# Altium footprint library Connector.PcbLib: 86 footprints (part 4 of 6)
Each footprint in its own frame and in the unit in brackets; x right, y up, seen from the top. Pads: shape width x height; smd on the part's side, far side on the other; paste and mask are expansions set on the pad; w line width, h text height; cw(c..) or ccw(c..) is an arc to the next point about the centre after c.
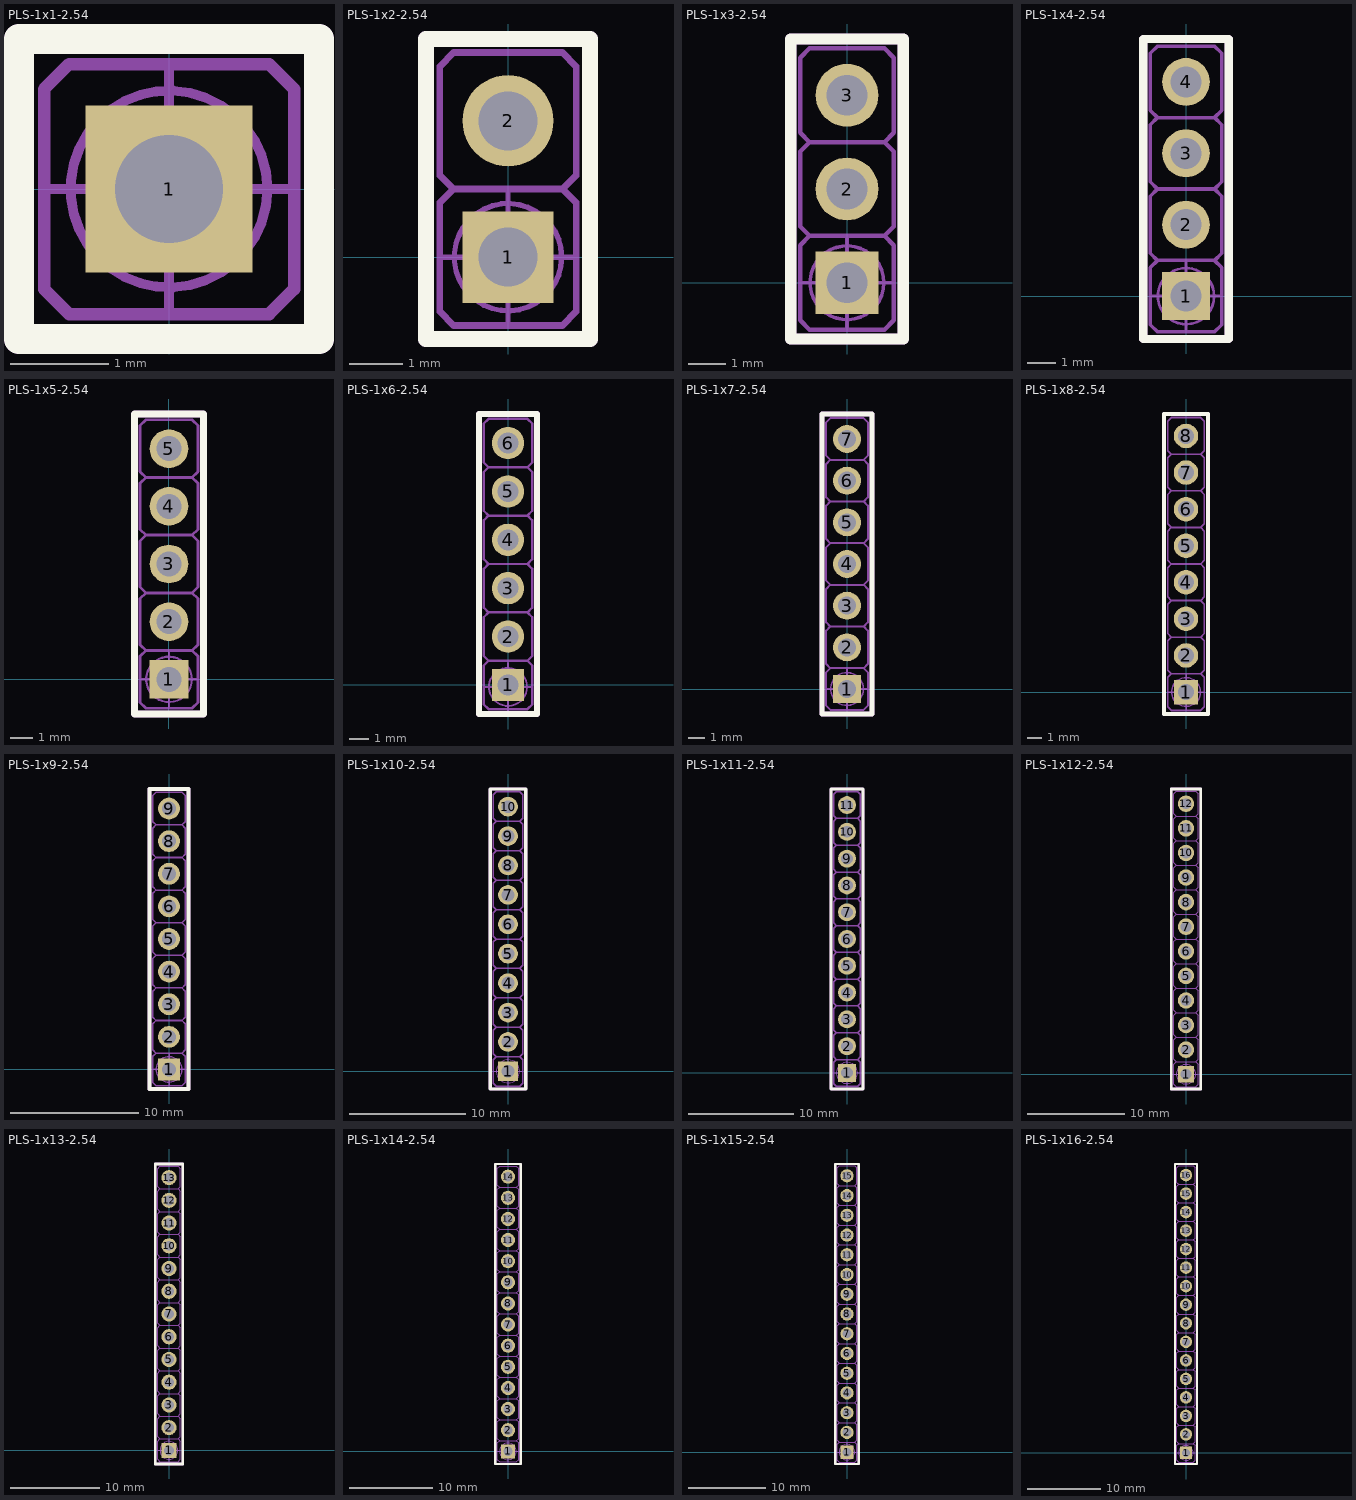
[diagram p3: the footprints below, top view; thin cyan lines are the x and y axes]

## PLS-1x1-2.54 [mm]
height 6
pads (1):
  rect 1.7x1.7 hole 1.1: 1(0,0)
Top Overlay:
  lines w0.3: -1.524,-1.524 -1.524,1.524 1.524,1.524 1.524,-1.524 -1.524,-1.524
Bottom Overlay:
  lines w0.3: -1.524,-1.524 1.524,-1.524 1.524,1.524 -1.524,1.524 -1.524,-1.524
Top Assembly:
  lines w0.127: -0.32,-0.32 0.32,-0.32 ; -0.32,-0.32 -0.16,-0.16 ; -0.32,-0.32 -0.32,0.32 ; -0.32,0.32 0.32,0.32 ; -0.32,0.32 -0.16,0.16 ; -0.16,-0.16 0.16,-0.16 ; -0.16,-0.16 -0.16,0.16 ; -0.16,0.16 0.16,0.16 ; 0.16,-0.16 0.32,-0.32 ; 0.16,-0.16 0.16,0.16 ; 0.16,0.16 0.32,0.32 ; 0.32,-0.32 0.32,0.32 ; -1.27,-1.016 -1.016,-1.27 1.016,-1.27 1.27,-1.016 1.27,1.016 1.016,1.27 -1.016,1.27 -1.27,1.016 -1.27,-1.016
Top Component Outline:
  lines w0.3: -1.524,-1.524 -1.524,1.524 1.524,1.524 1.524,-1.524 -1.524,-1.524
Top Component Center:
  circle w0.1: c0,0 r1
  lines w0.1: -1.25,0 1.25,0 ; 0,-1.25 0,1.25
3D body "PinHeader_1x01_P2.54mm_Vertical.step": height 8.54, standoff -3, extent -1.27,-1.27 1.27,1.27

## PLS-1x2-2.54 [mm]
height 6
pads (2):
  rect 1.7x1.7 hole 1.1: 1(0,0)
  round 1.7 hole 1.1: 2(0,2.54)
Top Overlay:
  lines w0.3: -1.524,-1.524 -1.524,4.064 1.524,4.064 1.524,-1.524 -1.524,-1.524
Bottom Overlay:
  lines w0.3: -1.524,-1.524 -1.524,4.064 1.524,4.064 1.524,-1.524 -1.524,-1.524
Top Assembly:
  lines w0.127: -1.016,1.27 -1.27,1.016 -1.27,-1.016 -1.016,-1.27 1.016,-1.27 1.27,-1.016 1.27,1.016 1.016,1.27 ; -1.016,1.27 -1.27,1.524 -1.27,3.556 -1.016,3.81 1.016,3.81 1.27,3.556 1.27,1.524 1.016,1.27 ; -1.016,1.27 1.016,1.27 ; -1.016,1.27 1.016,1.27 ; -0.32,-0.32 -0.32,0.32 ; -0.32,-0.32 -0.16,-0.16 ; -0.32,-0.32 0.32,-0.32 ; -0.32,0.32 -0.16,0.16 ; -0.32,0.32 0.32,0.32 ; -0.32,2.22 -0.32,2.86 ; -0.32,2.22 -0.16,2.38 ; -0.32,2.22 0.32,2.22 ; -0.32,2.86 -0.16,2.7 ; -0.32,2.86 0.32,2.86 ; -0.16,-0.16 -0.16,0.16 ; -0.16,-0.16 0.16,-0.16 ; -0.16,0.16 0.16,0.16 ; -0.16,2.38 -0.16,2.7 ; -0.16,2.38 0.16,2.38 ; -0.16,2.7 0.16,2.7 ; 0.16,-0.16 0.16,0.16 ; 0.16,-0.16 0.32,-0.32 ; 0.16,0.16 0.32,0.32 ; 0.16,2.38 0.16,2.7 ; 0.16,2.38 0.32,2.22 ; 0.16,2.7 0.32,2.86 ; 0.32,-0.32 0.32,0.32 ; 0.32,2.22 0.32,2.86
Top Component Outline:
  lines w0.3: -1.524,-1.524 1.524,-1.524 1.524,4.064 -1.524,4.064 -1.524,-1.524
Top Component Center:
  circle w0.1: c0,0 r1
  lines w0.1: -1.25,0 1.25,0 ; 0,-1.25 0,1.25
3D body "PinHeader_1x01_P2.54mm_Vertical.step": height 8.54, standoff -3, extent -1.27,1.27 1.27,3.81
3D body "PinHeader_1x01_P2.54mm_Vertical.step": height 8.54, standoff -3, extent -1.27,-1.27 1.27,1.27

## PLS-1x3-2.54 [mm]
height 6
pads (3):
  rect 1.7x1.7 hole 1.1: 1(0,0)
  round 1.7 hole 1.1: 2(0,2.54) 3(0,5.08)
Top Overlay:
  lines w0.3: -1.524,-1.524 -1.524,6.604 1.524,6.604 1.524,-1.524 -1.524,-1.524
Bottom Overlay:
  lines w0.3: -1.524,-1.524 1.524,-1.524 1.524,6.604 -1.524,6.604 -1.524,-1.524
Top Assembly:
  lines w0.127: -1.016,1.27 -1.27,1.016 -1.27,-1.016 -1.016,-1.27 1.016,-1.27 1.27,-1.016 1.27,1.016 1.016,1.27 ; -1.016,1.27 1.016,1.27 ; -1.016,1.27 -1.27,1.524 -1.27,3.556 -1.016,3.81 ; -1.016,1.27 1.016,1.27 ; -1.016,3.81 1.016,3.81 ; -1.016,3.81 -1.27,4.064 -1.27,6.096 -1.016,6.35 1.016,6.35 1.27,6.096 1.27,4.064 1.016,3.81 ; -1.016,3.81 1.016,3.81 ; -0.32,-0.32 -0.32,0.32 ; -0.32,-0.32 -0.16,-0.16 ; -0.32,-0.32 0.32,-0.32 ; -0.32,0.32 -0.16,0.16 ; -0.32,0.32 0.32,0.32 ; -0.32,2.22 -0.32,2.86 ; -0.32,2.22 -0.16,2.38 ; -0.32,2.22 0.32,2.22 ; -0.32,2.86 -0.16,2.7 ; -0.32,2.86 0.32,2.86 ; -0.32,4.76 -0.32,5.4 ; -0.32,4.76 -0.16,4.92 ; -0.32,4.76 0.32,4.76 ; -0.32,5.4 -0.16,5.24 ; -0.32,5.4 0.32,5.4 ; -0.16,-0.16 -0.16,0.16 ; -0.16,-0.16 0.16,-0.16 ; -0.16,0.16 0.16,0.16 ; -0.16,2.38 -0.16,2.7 ; -0.16,2.38 0.16,2.38 ; -0.16,2.7 0.16,2.7 ; -0.16,4.92 -0.16,5.24 ; -0.16,4.92 0.16,4.92 ; -0.16,5.24 0.16,5.24 ; 0.16,-0.16 0.16,0.16 ; 0.16,-0.16 0.32,-0.32 ; 0.16,0.16 0.32,0.32 ; 0.16,2.38 0.16,2.7 ; 0.16,2.38 0.32,2.22 ; 0.16,2.7 0.32,2.86 ; 0.16,4.92 0.16,5.24 ; 0.16,4.92 0.32,4.76 ; 0.16,5.24 0.32,5.4 ; 0.32,-0.32 0.32,0.32 ; 0.32,2.22 0.32,2.86 ; 0.32,4.76 0.32,5.4 ; 1.016,1.27 1.27,1.524 1.27,3.556 1.016,3.81
Top Component Outline:
  lines w0.3: -1.524,-1.524 1.524,-1.524 1.524,6.604 -1.524,6.604 -1.524,-1.524
Top Component Center:
  circle w0.1: c0,0 r1
  lines w0.1: -1.25,0 1.25,0 ; 0,-1.25 0,1.25
3D body "PinHeader_1x01_P2.54mm_Vertical.step": height 8.54, standoff -3, extent -1.27,-1.27 1.27,1.27
3D body "PinHeader_1x01_P2.54mm_Vertical.step": height 8.54, standoff -3, extent -1.27,1.27 1.27,3.81
3D body "PinHeader_1x01_P2.54mm_Vertical.step": height 8.54, standoff -3, extent -1.27,3.81 1.27,6.35

## PLS-1x4-2.54 [mm]
height 6
pads (4):
  rect 1.7x1.7 hole 1.1: 1(0,0)
  round 1.7 hole 1.1: 2(0,2.54) 3(0,5.08) 4(0,7.62)
Top Overlay:
  lines w0.3: -1.524,-1.524 1.524,-1.524 1.524,9.144 -1.524,9.144 -1.524,-1.524
Bottom Overlay:
  lines w0.3: -1.524,-1.524 -1.524,9.144 1.524,9.144 1.524,-1.524 -1.524,-1.524
Top Assembly:
  lines w0.127: -1.016,1.27 1.016,1.27 ; -1.016,1.27 -1.27,1.524 -1.27,3.556 -1.016,3.81 ; -1.016,1.27 1.016,1.27 ; -1.016,1.27 -1.27,1.016 -1.27,-1.016 -1.016,-1.27 1.016,-1.27 1.27,-1.016 1.27,1.016 1.016,1.27 ; -1.016,3.81 1.016,3.81 ; -1.016,3.81 -1.27,4.064 -1.27,6.096 -1.016,6.35 ; -1.016,3.81 1.016,3.81 ; -1.016,6.35 1.016,6.35 ; -1.016,6.35 -1.27,6.604 -1.27,8.636 -1.016,8.89 1.016,8.89 1.27,8.636 1.27,6.604 1.016,6.35 ; -1.016,6.35 1.016,6.35 ; -0.32,-0.32 0.32,-0.32 ; -0.32,-0.32 -0.16,-0.16 ; -0.32,-0.32 -0.32,0.32 ; -0.32,0.32 0.32,0.32 ; -0.32,0.32 -0.16,0.16 ; -0.32,2.22 0.32,2.22 ; -0.32,2.22 -0.16,2.38 ; -0.32,2.22 -0.32,2.86 ; -0.32,2.86 0.32,2.86 ; -0.32,2.86 -0.16,2.7 ; -0.32,4.76 0.32,4.76 ; -0.32,4.76 -0.16,4.92 ; -0.32,4.76 -0.32,5.4 ; -0.32,5.4 0.32,5.4 ; -0.32,5.4 -0.16,5.24 ; -0.32,7.3 0.32,7.3 ; -0.32,7.3 -0.16,7.46 ; -0.32,7.3 -0.32,7.94 ; -0.32,7.94 0.32,7.94 ; -0.32,7.94 -0.16,7.78 ; -0.16,-0.16 0.16,-0.16 ; -0.16,-0.16 -0.16,0.16 ; -0.16,0.16 0.16,0.16 ; -0.16,2.38 0.16,2.38 ; -0.16,2.38 -0.16,2.7 ; -0.16,2.7 0.16,2.7 ; -0.16,4.92 0.16,4.92 ; -0.16,4.92 -0.16,5.24 ; -0.16,5.24 0.16,5.24 ; -0.16,7.46 0.16,7.46 ; -0.16,7.46 -0.16,7.78 ; -0.16,7.78 0.16,7.78 ; 0.16,-0.16 0.32,-0.32 ; 0.16,-0.16 0.16,0.16 ; 0.16,0.16 0.32,0.32 ; 0.16,2.38 0.32,2.22 ; 0.16,2.38 0.16,2.7 ; 0.16,2.7 0.32,2.86 ; 0.16,4.92 0.32,4.76 ; 0.16,4.92 0.16,5.24 ; 0.16,5.24 0.32,5.4 ; 0.16,7.46 0.32,7.3 ; 0.16,7.46 0.16,7.78 ; 0.16,7.78 0.32,7.94 ; 0.32,-0.32 0.32,0.32 ; 0.32,2.22 0.32,2.86 ; 0.32,4.76 0.32,5.4 ; 0.32,7.3 0.32,7.94 ; 1.016,1.27 1.27,1.524 1.27,3.556 1.016,3.81 ; 1.016,3.81 1.27,4.064 1.27,6.096 1.016,6.35
Top Component Outline:
  lines w0.3: -1.524,-1.524 1.524,-1.524 1.524,9.144 -1.524,9.144 -1.524,-1.524
Top Component Center:
  circle w0.1: c0,0 r1
  lines w0.1: -1.25,0 1.25,0 ; 0,-1.25 0,1.25
3D body "PinHeader_1x01_P2.54mm_Vertical.step": height 8.54, standoff -3, extent -1.27,6.35 1.27,8.89
3D body "PinHeader_1x01_P2.54mm_Vertical.step": height 8.54, standoff -3, extent -1.27,3.81 1.27,6.35
3D body "PinHeader_1x01_P2.54mm_Vertical.step": height 8.54, standoff -3, extent -1.27,1.27 1.27,3.81
3D body "PinHeader_1x01_P2.54mm_Vertical.step": height 8.54, standoff -3, extent -1.27,-1.27 1.27,1.27

## PLS-1x5-2.54 [mm]
height 6
pads (5):
  rect 1.7x1.7 hole 1.1: 1(0,0)
  round 1.7 hole 1.1: 2(0,2.54) 3(0,5.08) 4(0,7.62) 5(0,10.16)
Top Overlay:
  lines w0.3: -1.524,-1.524 -1.524,11.684 1.524,11.684 1.524,-1.524 -1.524,-1.524
Bottom Overlay:
  lines w0.3: -1.524,-1.524 -1.524,11.684 1.524,11.684 1.524,-1.524 -1.524,-1.524
Top Assembly:
  lines w0.127: -1.016,1.27 -1.27,1.016 -1.27,-1.016 -1.016,-1.27 1.016,-1.27 1.27,-1.016 1.27,1.016 1.016,1.27 ; -1.016,1.27 1.016,1.27 ; -1.016,1.27 -1.27,1.524 -1.27,3.556 -1.016,3.81 ; -1.016,1.27 1.016,1.27 ; -1.016,3.81 1.016,3.81 ; -1.016,3.81 -1.27,4.064 -1.27,6.096 -1.016,6.35 ; -1.016,3.81 1.016,3.81 ; -1.016,6.35 1.016,6.35 ; -1.016,6.35 -1.27,6.604 -1.27,8.636 -1.016,8.89 ; -1.016,6.35 1.016,6.35 ; -1.016,8.89 1.016,8.89 ; -1.016,8.89 -1.27,9.144 -1.27,11.176 -1.016,11.43 1.016,11.43 1.27,11.176 1.27,9.144 1.016,8.89 ; -1.016,8.89 1.016,8.89 ; -0.32,-0.32 -0.32,0.32 ; -0.32,-0.32 -0.16,-0.16 ; -0.32,-0.32 0.32,-0.32 ; -0.32,0.32 -0.16,0.16 ; -0.32,0.32 0.32,0.32 ; -0.32,2.22 -0.32,2.86 ; -0.32,2.22 -0.16,2.38 ; -0.32,2.22 0.32,2.22 ; -0.32,2.86 -0.16,2.7 ; -0.32,2.86 0.32,2.86 ; -0.32,4.76 -0.32,5.4 ; -0.32,4.76 -0.16,4.92 ; -0.32,4.76 0.32,4.76 ; -0.32,5.4 -0.16,5.24 ; -0.32,5.4 0.32,5.4 ; -0.32,7.3 -0.32,7.94 ; -0.32,7.3 -0.16,7.46 ; -0.32,7.3 0.32,7.3 ; -0.32,7.94 -0.16,7.78 ; -0.32,7.94 0.32,7.94 ; -0.32,9.84 -0.32,10.48 ; -0.32,9.84 -0.16,10 ; -0.32,9.84 0.32,9.84 ; -0.32,10.48 -0.16,10.32 ; -0.32,10.48 0.32,10.48 ; -0.16,-0.16 -0.16,0.16 ; -0.16,-0.16 0.16,-0.16 ; -0.16,0.16 0.16,0.16 ; -0.16,2.38 -0.16,2.7 ; -0.16,2.38 0.16,2.38 ; -0.16,2.7 0.16,2.7 ; -0.16,4.92 -0.16,5.24 ; -0.16,4.92 0.16,4.92 ; -0.16,5.24 0.16,5.24 ; -0.16,7.46 -0.16,7.78 ; -0.16,7.46 0.16,7.46 ; -0.16,7.78 0.16,7.78 ; -0.16,10 -0.16,10.32 ; -0.16,10 0.16,10 ; -0.16,10.32 0.16,10.32 ; 0.16,-0.16 0.16,0.16 ; 0.16,-0.16 0.32,-0.32 ; 0.16,0.16 0.32,0.32 ; 0.16,2.38 0.16,2.7 ; 0.16,2.38 0.32,2.22 ; 0.16,2.7 0.32,2.86 ; 0.16,4.92 0.16,5.24 ; 0.16,4.92 0.32,4.76 ; 0.16,5.24 0.32,5.4 ; 0.16,7.46 0.16,7.78 ; 0.16,7.46 0.32,7.3 ; 0.16,7.78 0.32,7.94 ; 0.16,10 0.16,10.32 ; 0.16,10 0.32,9.84 ; 0.16,10.32 0.32,10.48 ; 0.32,-0.32 0.32,0.32 ; 0.32,2.22 0.32,2.86 ; 0.32,4.76 0.32,5.4 ; 0.32,7.3 0.32,7.94 ; 0.32,9.84 0.32,10.48 ; 1.016,1.27 1.27,1.524 1.27,3.556 1.016,3.81 ; 1.016,3.81 1.27,4.064 1.27,6.096 1.016,6.35 ; 1.016,6.35 1.27,6.604 1.27,8.636 1.016,8.89
Top Component Outline:
  lines w0.3: -1.524,-1.524 -1.524,11.684 1.524,11.684 1.524,-1.524 -1.524,-1.524
Top Component Center:
  circle w0.1: c0,0 r1
  lines w0.1: -1.25,0 1.25,0 ; 0,-1.25 0,1.25
3D body "PinHeader_1x01_P2.54mm_Vertical.step": height 8.54, standoff -3, extent -1.27,6.35 1.27,8.89
3D body "PinHeader_1x01_P2.54mm_Vertical.step": height 8.54, standoff -3, extent -1.27,3.81 1.27,6.35
3D body "PinHeader_1x01_P2.54mm_Vertical.step": height 8.54, standoff -3, extent -1.27,1.27 1.27,3.81
3D body "PinHeader_1x01_P2.54mm_Vertical.step": height 8.54, standoff -3, extent -1.27,-1.27 1.27,1.27
3D body "PinHeader_1x01_P2.54mm_Vertical.step": height 8.54, standoff -3, extent -1.27,8.89 1.27,11.43

## PLS-1x6-2.54 [mm]
height 6
pads (6):
  rect 1.7x1.7 hole 1.1: 1(0,0)
  round 1.7 hole 1.1: 2(0,2.54) 3(0,5.08) 4(0,7.62) 5(0,10.16) 6(0,12.7)
Top Overlay:
  lines w0.3: -1.524,-1.524 -1.524,14.224 1.524,14.224 1.524,-1.524 -1.524,-1.524
Bottom Overlay:
  lines w0.3: -1.524,-1.524 1.524,-1.524 1.524,14.224 -1.524,14.224 -1.524,-1.524
Top Assembly:
  lines w0.127: -1.016,1.27 -1.27,1.016 -1.27,-1.016 -1.016,-1.27 1.016,-1.27 1.27,-1.016 1.27,1.016 1.016,1.27 ; -1.016,1.27 1.016,1.27 ; -1.016,1.27 -1.27,1.524 -1.27,3.556 -1.016,3.81 ; -1.016,1.27 1.016,1.27 ; -1.016,3.81 1.016,3.81 ; -1.016,3.81 -1.27,4.064 -1.27,6.096 -1.016,6.35 ; -1.016,3.81 1.016,3.81 ; -1.016,6.35 1.016,6.35 ; -1.016,6.35 -1.27,6.604 -1.27,8.636 -1.016,8.89 ; -1.016,6.35 1.016,6.35 ; -1.016,8.89 1.016,8.89 ; -1.016,8.89 -1.27,9.144 -1.27,11.176 -1.016,11.43 ; -1.016,8.89 1.016,8.89 ; -1.016,11.43 1.016,11.43 ; -1.016,11.43 -1.27,11.684 -1.27,13.716 -1.016,13.97 1.016,13.97 1.27,13.716 1.27,11.684 1.016,11.43 ; -1.016,11.43 1.016,11.43 ; -0.32,-0.32 -0.32,0.32 ; -0.32,-0.32 -0.16,-0.16 ; -0.32,-0.32 0.32,-0.32 ; -0.32,0.32 -0.16,0.16 ; -0.32,0.32 0.32,0.32 ; -0.32,2.22 -0.32,2.86 ; -0.32,2.22 -0.16,2.38 ; -0.32,2.22 0.32,2.22 ; -0.32,2.86 -0.16,2.7 ; -0.32,2.86 0.32,2.86 ; -0.32,4.76 -0.32,5.4 ; -0.32,4.76 -0.16,4.92 ; -0.32,4.76 0.32,4.76 ; -0.32,5.4 -0.16,5.24 ; -0.32,5.4 0.32,5.4 ; -0.32,7.3 -0.32,7.94 ; -0.32,7.3 -0.16,7.46 ; -0.32,7.3 0.32,7.3 ; -0.32,7.94 -0.16,7.78 ; -0.32,7.94 0.32,7.94 ; -0.32,9.84 -0.32,10.48 ; -0.32,9.84 -0.16,10 ; -0.32,9.84 0.32,9.84 ; -0.32,10.48 -0.16,10.32 ; -0.32,10.48 0.32,10.48 ; -0.32,12.38 -0.32,13.02 ; -0.32,12.38 -0.16,12.54 ; -0.32,12.38 0.32,12.38 ; -0.32,13.02 -0.16,12.86 ; -0.32,13.02 0.32,13.02 ; -0.16,-0.16 -0.16,0.16 ; -0.16,-0.16 0.16,-0.16 ; -0.16,0.16 0.16,0.16 ; -0.16,2.38 -0.16,2.7 ; -0.16,2.38 0.16,2.38 ; -0.16,2.7 0.16,2.7 ; -0.16,4.92 -0.16,5.24 ; -0.16,4.92 0.16,4.92 ; -0.16,5.24 0.16,5.24 ; -0.16,7.46 -0.16,7.78 ; -0.16,7.46 0.16,7.46 ; -0.16,7.78 0.16,7.78 ; -0.16,10 -0.16,10.32 ; -0.16,10 0.16,10 ; -0.16,10.32 0.16,10.32 ; -0.16,12.54 -0.16,12.86 ; -0.16,12.54 0.16,12.54 ; -0.16,12.86 0.16,12.86 ; 0.16,-0.16 0.16,0.16 ; 0.16,-0.16 0.32,-0.32 ; 0.16,0.16 0.32,0.32 ; 0.16,2.38 0.16,2.7 ; 0.16,2.38 0.32,2.22 ; 0.16,2.7 0.32,2.86 ; 0.16,4.92 0.16,5.24 ; 0.16,4.92 0.32,4.76 ; 0.16,5.24 0.32,5.4 ; 0.16,7.46 0.16,7.78 ; 0.16,7.46 0.32,7.3 ; 0.16,7.78 0.32,7.94 ; 0.16,10 0.16,10.32 ; 0.16,10 0.32,9.84 ; 0.16,10.32 0.32,10.48 ; 0.16,12.54 0.16,12.86 ; 0.16,12.54 0.32,12.38 ; 0.16,12.86 0.32,13.02 ; 0.32,-0.32 0.32,0.32 ; 0.32,2.22 0.32,2.86 ; 0.32,4.76 0.32,5.4 ; 0.32,7.3 0.32,7.94 ; 0.32,9.84 0.32,10.48 ; 0.32,12.38 0.32,13.02 ; 1.016,1.27 1.27,1.524 1.27,3.556 1.016,3.81 ; 1.016,3.81 1.27,4.064 1.27,6.096 1.016,6.35 ; 1.016,6.35 1.27,6.604 1.27,8.636 1.016,8.89 ; 1.016,8.89 1.27,9.144 1.27,11.176 1.016,11.43
Top Component Outline:
  lines w0.3: -1.524,-1.524 -1.524,14.224 1.524,14.224 1.524,-1.524 -1.524,-1.524
Top Component Center:
  circle w0.1: c0,-0.102 r1
  lines w0.1: -1.25,-0.102 1.25,-0.102 ; 0,-1.352 0,1.148
3D body "PinHeader_1x01_P2.54mm_Vertical.step": height 8.54, standoff -3, extent -1.27,11.43 1.27,13.97
3D body "PinHeader_1x01_P2.54mm_Vertical.step": height 8.54, standoff -3, extent -1.27,6.35 1.27,8.89
3D body "PinHeader_1x01_P2.54mm_Vertical.step": height 8.54, standoff -3, extent -1.27,3.81 1.27,6.35
3D body "PinHeader_1x01_P2.54mm_Vertical.step": height 8.54, standoff -3, extent -1.27,1.27 1.27,3.81
3D body "PinHeader_1x01_P2.54mm_Vertical.step": height 8.54, standoff -3, extent -1.27,-1.27 1.27,1.27
3D body "PinHeader_1x01_P2.54mm_Vertical.step": height 8.54, standoff -3, extent -1.27,8.89 1.27,11.43

## PLS-1x7-2.54 [mm]
height 6
pads (7):
  rect 1.7x1.7 hole 1.1: 1(0,0)
  round 1.7 hole 1.1: 2(0,2.54) 3(0,5.08) 4(0,7.62) 5(0,10.16) 6(0,12.7) 7(0,15.24)
Top Overlay:
  lines w0.3: -1.524,-1.524 1.524,-1.524 1.524,16.764 -1.524,16.764 -1.524,-1.524
Bottom Overlay:
  lines w0.3: -1.524,-1.524 -1.524,16.764 1.524,16.764 1.524,-1.524 -1.524,-1.524
Top Assembly:
  lines w0.127: -1.016,1.27 -1.27,1.016 -1.27,-1.016 -1.016,-1.27 1.016,-1.27 1.27,-1.016 1.27,1.016 1.016,1.27 ; -1.016,1.27 1.016,1.27 ; -1.016,1.27 -1.27,1.524 -1.27,3.556 -1.016,3.81 ; -1.016,1.27 1.016,1.27 ; -1.016,3.81 1.016,3.81 ; -1.016,3.81 -1.27,4.064 -1.27,6.096 -1.016,6.35 ; -1.016,3.81 1.016,3.81 ; -1.016,6.35 1.016,6.35 ; -1.016,6.35 -1.27,6.604 -1.27,8.636 -1.016,8.89 ; -1.016,6.35 1.016,6.35 ; -1.016,8.89 1.016,8.89 ; -1.016,8.89 -1.27,9.144 -1.27,11.176 -1.016,11.43 ; -1.016,8.89 1.016,8.89 ; -1.016,11.43 1.016,11.43 ; -1.016,11.43 -1.27,11.684 -1.27,13.716 -1.016,13.97 ; -1.016,11.43 1.016,11.43 ; -1.016,13.97 1.016,13.97 ; -1.016,13.97 -1.27,14.224 -1.27,16.256 -1.016,16.51 1.016,16.51 1.27,16.256 1.27,14.224 1.016,13.97 ; -1.016,13.97 1.016,13.97 ; -0.32,-0.32 -0.32,0.32 ; -0.32,-0.32 -0.16,-0.16 ; -0.32,-0.32 0.32,-0.32 ; -0.32,0.32 -0.16,0.16 ; -0.32,0.32 0.32,0.32 ; -0.32,2.22 -0.32,2.86 ; -0.32,2.22 -0.16,2.38 ; -0.32,2.22 0.32,2.22 ; -0.32,2.86 -0.16,2.7 ; -0.32,2.86 0.32,2.86 ; -0.32,4.76 -0.32,5.4 ; -0.32,4.76 -0.16,4.92 ; -0.32,4.76 0.32,4.76 ; -0.32,5.4 -0.16,5.24 ; -0.32,5.4 0.32,5.4 ; -0.32,7.3 -0.32,7.94 ; -0.32,7.3 -0.16,7.46 ; -0.32,7.3 0.32,7.3 ; -0.32,7.94 -0.16,7.78 ; -0.32,7.94 0.32,7.94 ; -0.32,9.84 -0.32,10.48 ; -0.32,9.84 -0.16,10 ; -0.32,9.84 0.32,9.84 ; -0.32,10.48 -0.16,10.32 ; -0.32,10.48 0.32,10.48 ; -0.32,12.38 -0.32,13.02 ; -0.32,12.38 -0.16,12.54 ; -0.32,12.38 0.32,12.38 ; -0.32,13.02 -0.16,12.86 ; -0.32,13.02 0.32,13.02 ; -0.32,14.92 -0.32,15.56 ; -0.32,14.92 -0.16,15.08 ; -0.32,14.92 0.32,14.92 ; -0.32,15.56 -0.16,15.4 ; -0.32,15.56 0.32,15.56 ; -0.16,-0.16 -0.16,0.16 ; -0.16,-0.16 0.16,-0.16 ; -0.16,0.16 0.16,0.16 ; -0.16,2.38 -0.16,2.7 ; -0.16,2.38 0.16,2.38 ; -0.16,2.7 0.16,2.7 ; -0.16,4.92 -0.16,5.24 ; -0.16,4.92 0.16,4.92 ; -0.16,5.24 0.16,5.24 ; -0.16,7.46 -0.16,7.78 ; -0.16,7.46 0.16,7.46 ; -0.16,7.78 0.16,7.78 ; -0.16,10 -0.16,10.32 ; -0.16,10 0.16,10 ; -0.16,10.32 0.16,10.32 ; -0.16,12.54 -0.16,12.86 ; -0.16,12.54 0.16,12.54 ; -0.16,12.86 0.16,12.86 ; -0.16,15.08 -0.16,15.4 ; -0.16,15.08 0.16,15.08 ; -0.16,15.4 0.16,15.4 ; 0.16,-0.16 0.16,0.16 ; 0.16,-0.16 0.32,-0.32 ; 0.16,0.16 0.32,0.32 ; 0.16,2.38 0.16,2.7 ; 0.16,2.38 0.32,2.22 ; 0.16,2.7 0.32,2.86 ; 0.16,4.92 0.16,5.24 ; 0.16,4.92 0.32,4.76 ; 0.16,5.24 0.32,5.4 ; 0.16,7.46 0.16,7.78 ; 0.16,7.46 0.32,7.3 ; 0.16,7.78 0.32,7.94 ; 0.16,10 0.16,10.32 ; 0.16,10 0.32,9.84 ; 0.16,10.32 0.32,10.48 ; 0.16,12.54 0.16,12.86 ; 0.16,12.54 0.32,12.38 ; 0.16,12.86 0.32,13.02 ; 0.16,15.08 0.16,15.4 ; 0.16,15.08 0.32,14.92 ; 0.16,15.4 0.32,15.56 ; 0.32,-0.32 0.32,0.32 ; 0.32,2.22 0.32,2.86 ; 0.32,4.76 0.32,5.4 ; 0.32,7.3 0.32,7.94 ; 0.32,9.84 0.32,10.48 ; 0.32,12.38 0.32,13.02 ; 0.32,14.92 0.32,15.56 ; 1.016,1.27 1.27,1.524 1.27,3.556 1.016,3.81 ; 1.016,3.81 1.27,4.064 1.27,6.096 1.016,6.35 ; 1.016,6.35 1.27,6.604 1.27,8.636 1.016,8.89 ; 1.016,8.89 1.27,9.144 1.27,11.176 1.016,11.43 ; 1.016,11.43 1.27,11.684 1.27,13.716 1.016,13.97
Top Component Outline:
  lines w0.3: -1.524,-1.524 1.524,-1.524 1.524,16.764 -1.524,16.764 -1.524,-1.524
Top Component Center:
  circle w0.1: c0,0 r1
  lines w0.1: -1.25,0 1.25,0 ; 0,-1.25 0,1.25
3D body "PinHeader_1x01_P2.54mm_Vertical.step": height 8.54, standoff -3, extent -1.27,13.97 1.27,16.51
3D body "PinHeader_1x01_P2.54mm_Vertical.step": height 8.54, standoff -3, extent -1.27,8.89 1.27,11.43
3D body "PinHeader_1x01_P2.54mm_Vertical.step": height 8.54, standoff -3, extent -1.27,-1.27 1.27,1.27
3D body "PinHeader_1x01_P2.54mm_Vertical.step": height 8.54, standoff -3, extent -1.27,1.27 1.27,3.81
3D body "PinHeader_1x01_P2.54mm_Vertical.step": height 8.54, standoff -3, extent -1.27,3.81 1.27,6.35
3D body "PinHeader_1x01_P2.54mm_Vertical.step": height 8.54, standoff -3, extent -1.27,6.35 1.27,8.89
3D body "PinHeader_1x01_P2.54mm_Vertical.step": height 8.54, standoff -3, extent -1.27,11.43 1.27,13.97

## PLS-1x8-2.54 [mm]
height 6
pads (8):
  rect 1.7x1.7 hole 1.1: 1(0,0)
  round 1.7 hole 1.1: 2(0,2.54) 3(0,5.08) 4(0,7.62) 5(0,10.16) 6(0,12.7) 7(0,15.24) 8(0,17.78)
Top Overlay:
  lines w0.3: -1.524,-1.524 -1.524,19.304 1.524,19.304 1.524,-1.524 -1.524,-1.524
Bottom Overlay:
  lines w0.3: -1.524,-1.524 1.524,-1.524 1.524,19.304 -1.524,19.304 -1.524,-1.524
Top Assembly:
  drawing of 160 lines, arcs and shapes, not listed
Top Component Outline:
  lines w0.3: -1.524,-1.524 -1.524,19.304 1.524,19.304 1.524,-1.524 -1.524,-1.524
Top Component Center:
  circle w0.1: c0,0 r1
  lines w0.1: -1.25,0 1.25,0 ; 0,-1.25 0,1.25
3D body "PinHeader_1x01_P2.54mm_Vertical.step": height 8.54, standoff -3, extent -1.27,16.51 1.27,19.05
3D body "PinHeader_1x01_P2.54mm_Vertical.step": height 8.54, standoff -3, extent -1.27,11.43 1.27,13.97
3D body "PinHeader_1x01_P2.54mm_Vertical.step": height 8.54, standoff -3, extent -1.27,6.35 1.27,8.89
3D body "PinHeader_1x01_P2.54mm_Vertical.step": height 8.54, standoff -3, extent -1.27,3.81 1.27,6.35
3D body "PinHeader_1x01_P2.54mm_Vertical.step": height 8.54, standoff -3, extent -1.27,1.27 1.27,3.81
3D body "PinHeader_1x01_P2.54mm_Vertical.step": height 8.54, standoff -3, extent -1.27,-1.27 1.27,1.27
3D body "PinHeader_1x01_P2.54mm_Vertical.step": height 8.54, standoff -3, extent -1.27,8.89 1.27,11.43
3D body "PinHeader_1x01_P2.54mm_Vertical.step": height 8.54, standoff -3, extent -1.27,13.97 1.27,16.51

## PLS-1x9-2.54 [mm]
height 6
pads (9):
  rect 1.7x1.7 hole 1.1: 1(0,0)
  round 1.7 hole 1.1: 2(0,2.54) 3(0,5.08) 4(0,7.62) 5(0,10.16) 6(0,12.7) 7(0,15.24) 8(0,17.78) 9(0,20.32)
Top Overlay:
  lines w0.3: -1.524,-1.524 -1.524,21.844 1.524,21.844 1.524,-1.524 -1.524,-1.524
Bottom Overlay:
  lines w0.3: -1.524,-1.524 1.524,-1.524 1.524,21.844 -1.524,21.844 -1.524,-1.524
Top Assembly:
  drawing of 180 lines, arcs and shapes, not listed
Top Component Outline:
  lines w0.3: -1.524,-1.524 -1.524,21.844 1.524,21.844 1.524,-1.524 -1.524,-1.524
Top Component Center:
  circle w0.1: c0,0 r1
  lines w0.1: -1.25,0 1.25,0 ; 0,-1.25 0,1.25
3D body "PinHeader_1x01_P2.54mm_Vertical.step": height 8.54, standoff -3, extent -1.27,19.05 1.27,21.59
3D body "PinHeader_1x01_P2.54mm_Vertical.step": height 8.54, standoff -3, extent -1.27,16.51 1.27,19.05
3D body "PinHeader_1x01_P2.54mm_Vertical.step": height 8.54, standoff -3, extent -1.27,11.43 1.27,13.97
3D body "PinHeader_1x01_P2.54mm_Vertical.step": height 8.54, standoff -3, extent -1.27,6.35 1.27,8.89
3D body "PinHeader_1x01_P2.54mm_Vertical.step": height 8.54, standoff -3, extent -1.27,3.81 1.27,6.35
3D body "PinHeader_1x01_P2.54mm_Vertical.step": height 8.54, standoff -3, extent -1.27,1.27 1.27,3.81
3D body "PinHeader_1x01_P2.54mm_Vertical.step": height 8.54, standoff -3, extent -1.27,-1.27 1.27,1.27
3D body "PinHeader_1x01_P2.54mm_Vertical.step": height 8.54, standoff -3, extent -1.27,8.89 1.27,11.43
3D body "PinHeader_1x01_P2.54mm_Vertical.step": height 8.54, standoff -3, extent -1.27,13.97 1.27,16.51

## PLS-1x10-2.54 [mm]
height 6
pads (10):
  rect 1.7x1.7 hole 1.1: 1(0,0)
  round 1.7 hole 1.1: 2(0,2.54) 3(0,5.08) 4(0,7.62) 5(0,10.16) 6(0,12.7) 7(0,15.24) 8(0,17.78) 9(0,20.32) 10(0,22.86)
Top Overlay:
  lines w0.3: -1.524,-1.524 1.524,-1.524 1.524,24.384 -1.524,24.384 -1.524,-1.524
Bottom Overlay:
  lines w0.3: -1.524,-1.524 -1.524,24.384 1.524,24.384 1.524,-1.524 -1.524,-1.524
Top Assembly:
  drawing of 200 lines, arcs and shapes, not listed
Top Component Outline:
  lines w0.3: -1.524,-1.524 1.524,-1.524 1.524,24.384 -1.524,24.384 -1.524,-1.524
Top Component Center:
  circle w0.1: c0,0 r1
  lines w0.1: -1.25,0 1.25,0 ; 0,-1.25 0,1.25
3D body "PinHeader_1x01_P2.54mm_Vertical.step": height 8.54, standoff -3, extent -1.27,19.05 1.27,21.59
3D body "PinHeader_1x01_P2.54mm_Vertical.step": height 8.54, standoff -3, extent -1.27,21.59 1.27,24.13
3D body "PinHeader_1x01_P2.54mm_Vertical.step": height 8.54, standoff -3, extent -1.27,13.97 1.27,16.51
3D body "PinHeader_1x01_P2.54mm_Vertical.step": height 8.54, standoff -3, extent -1.27,8.89 1.27,11.43
3D body "PinHeader_1x01_P2.54mm_Vertical.step": height 8.54, standoff -3, extent -1.27,-1.27 1.27,1.27
3D body "PinHeader_1x01_P2.54mm_Vertical.step": height 8.54, standoff -3, extent -1.27,1.27 1.27,3.81
3D body "PinHeader_1x01_P2.54mm_Vertical.step": height 8.54, standoff -3, extent -1.27,3.81 1.27,6.35
3D body "PinHeader_1x01_P2.54mm_Vertical.step": height 8.54, standoff -3, extent -1.27,6.35 1.27,8.89
3D body "PinHeader_1x01_P2.54mm_Vertical.step": height 8.54, standoff -3, extent -1.27,11.43 1.27,13.97
3D body "PinHeader_1x01_P2.54mm_Vertical.step": height 8.54, standoff -3, extent -1.27,16.51 1.27,19.05

## PLS-1x11-2.54 [mm]
height 6
pads (11):
  rect 1.7x1.7 hole 1.1: 1(0,0)
  round 1.7 hole 1.1: 2(0,2.54) 3(0,5.08) 4(0,7.62) 5(0,10.16) 6(0,12.7) 7(0,15.24) 8(0,17.78) 9(0,20.32) 10(0,22.86) 11(0,25.4)
Top Overlay:
  lines w0.3: -1.524,-1.524 -1.524,26.924 1.524,26.924 1.524,-1.524 -1.524,-1.524
Bottom Overlay:
  lines w0.3: -1.524,-1.524 -1.524,26.924 1.524,26.924 1.524,-1.524 -1.524,-1.524
Top Assembly:
  drawing of 220 lines, arcs and shapes, not listed
Top Component Outline:
  lines w0.3: -1.524,-1.524 -1.524,26.924 1.524,26.924 1.524,-1.524 -1.524,-1.524
Top Component Center:
  circle w0.1: c0,0 r1
  lines w0.1: -1.25,0 1.25,0 ; 0,-1.25 0,1.25
3D body "PinHeader_1x01_P2.54mm_Vertical.step": height 8.54, standoff -3, extent -1.27,24.13 1.27,26.67
3D body "PinHeader_1x01_P2.54mm_Vertical.step": height 8.54, standoff -3, extent -1.27,16.51 1.27,19.05
3D body "PinHeader_1x01_P2.54mm_Vertical.step": height 8.54, standoff -3, extent -1.27,11.43 1.27,13.97
3D body "PinHeader_1x01_P2.54mm_Vertical.step": height 8.54, standoff -3, extent -1.27,6.35 1.27,8.89
3D body "PinHeader_1x01_P2.54mm_Vertical.step": height 8.54, standoff -3, extent -1.27,3.81 1.27,6.35
3D body "PinHeader_1x01_P2.54mm_Vertical.step": height 8.54, standoff -3, extent -1.27,1.27 1.27,3.81
3D body "PinHeader_1x01_P2.54mm_Vertical.step": height 8.54, standoff -3, extent -1.27,-1.27 1.27,1.27
3D body "PinHeader_1x01_P2.54mm_Vertical.step": height 8.54, standoff -3, extent -1.27,8.89 1.27,11.43
3D body "PinHeader_1x01_P2.54mm_Vertical.step": height 8.54, standoff -3, extent -1.27,13.97 1.27,16.51
3D body "PinHeader_1x01_P2.54mm_Vertical.step": height 8.54, standoff -3, extent -1.27,21.59 1.27,24.13
3D body "PinHeader_1x01_P2.54mm_Vertical.step": height 8.54, standoff -3, extent -1.27,19.05 1.27,21.59

## PLS-1x12-2.54 [mm]
height 6
pads (12):
  rect 1.7x1.7 hole 1.1: 1(0,0)
  round 1.7 hole 1.1: 2(0,2.54) 3(0,5.08) 4(0,7.62) 5(0,10.16) 6(0,12.7) 7(0,15.24) 8(0,17.78) 9(0,20.32) 10(0,22.86) 11(0,25.4) 12(0,27.94)
Top Overlay:
  lines w0.3: -1.524,-1.524 -1.524,29.464 1.524,29.464 1.524,-1.524 -1.524,-1.524
Bottom Overlay:
  lines w0.3: -1.524,-1.524 -1.524,29.464 1.524,29.464 1.524,-1.524 -1.524,-1.524
Top Assembly:
  drawing of 240 lines, arcs and shapes, not listed
Top Component Outline:
  lines w0.3: -1.524,-1.524 -1.524,29.464 1.524,29.464 1.524,-1.524 -1.524,-1.524
Top Component Center:
  circle w0.1: c0,0 r1
  lines w0.1: -1.25,0 1.25,0 ; 0,-1.25 0,1.25
3D body "PinHeader_1x01_P2.54mm_Vertical.step": height 8.54, standoff -3, extent -1.27,26.67 1.27,29.21
3D body "PinHeader_1x01_P2.54mm_Vertical.step": height 8.54, standoff -3, extent -1.27,19.05 1.27,21.59
3D body "PinHeader_1x01_P2.54mm_Vertical.step": height 8.54, standoff -3, extent -1.27,21.59 1.27,24.13
3D body "PinHeader_1x01_P2.54mm_Vertical.step": height 8.54, standoff -3, extent -1.27,13.97 1.27,16.51
3D body "PinHeader_1x01_P2.54mm_Vertical.step": height 8.54, standoff -3, extent -1.27,8.89 1.27,11.43
3D body "PinHeader_1x01_P2.54mm_Vertical.step": height 8.54, standoff -3, extent -1.27,-1.27 1.27,1.27
3D body "PinHeader_1x01_P2.54mm_Vertical.step": height 8.54, standoff -3, extent -1.27,1.27 1.27,3.81
3D body "PinHeader_1x01_P2.54mm_Vertical.step": height 8.54, standoff -3, extent -1.27,3.81 1.27,6.35
3D body "PinHeader_1x01_P2.54mm_Vertical.step": height 8.54, standoff -3, extent -1.27,6.35 1.27,8.89
3D body "PinHeader_1x01_P2.54mm_Vertical.step": height 8.54, standoff -3, extent -1.27,11.43 1.27,13.97
3D body "PinHeader_1x01_P2.54mm_Vertical.step": height 8.54, standoff -3, extent -1.27,16.51 1.27,19.05
3D body "PinHeader_1x01_P2.54mm_Vertical.step": height 8.54, standoff -3, extent -1.27,24.13 1.27,26.67

## PLS-1x13-2.54 [mm]
height 6
pads (13):
  rect 1.7x1.7 hole 1.1: 1(0,0)
  round 1.7 hole 1.1: 2(0,2.54) 3(0,5.08) 4(0,7.62) 5(0,10.16) 6(0,12.7) 7(0,15.24) 8(0,17.78) 9(0,20.32) 10(0,22.86) 11(0,25.4) 12(0,27.94) 13(0,30.48)
Top Overlay:
  lines w0.3: -1.524,-1.524 -1.524,32.004 1.524,32.004 1.524,-1.524 -1.524,-1.524
Bottom Overlay:
  lines w0.3: -1.524,-1.524 -1.524,32.004 1.524,32.004 1.524,-1.524 -1.524,-1.524
Top Assembly:
  drawing of 260 lines, arcs and shapes, not listed
Top Component Outline:
  lines w0.3: -1.524,-1.524 -1.524,32.004 1.524,32.004 1.524,-1.524 -1.524,-1.524
Top Component Center:
  circle w0.1: c0,0 r1
  lines w0.1: -1.25,0 1.25,0 ; 0,-1.25 0,1.25
3D body "PinHeader_1x01_P2.54mm_Vertical.step": height 8.54, standoff -3, extent -1.27,29.21 1.27,31.75
3D body "PinHeader_1x01_P2.54mm_Vertical.step": height 8.54, standoff -3, extent -1.27,26.67 1.27,29.21
3D body "PinHeader_1x01_P2.54mm_Vertical.step": height 8.54, standoff -3, extent -1.27,19.05 1.27,21.59
3D body "PinHeader_1x01_P2.54mm_Vertical.step": height 8.54, standoff -3, extent -1.27,21.59 1.27,24.13
3D body "PinHeader_1x01_P2.54mm_Vertical.step": height 8.54, standoff -3, extent -1.27,13.97 1.27,16.51
3D body "PinHeader_1x01_P2.54mm_Vertical.step": height 8.54, standoff -3, extent -1.27,8.89 1.27,11.43
3D body "PinHeader_1x01_P2.54mm_Vertical.step": height 8.54, standoff -3, extent -1.27,-1.27 1.27,1.27
3D body "PinHeader_1x01_P2.54mm_Vertical.step": height 8.54, standoff -3, extent -1.27,1.27 1.27,3.81
3D body "PinHeader_1x01_P2.54mm_Vertical.step": height 8.54, standoff -3, extent -1.27,3.81 1.27,6.35
3D body "PinHeader_1x01_P2.54mm_Vertical.step": height 8.54, standoff -3, extent -1.27,6.35 1.27,8.89
3D body "PinHeader_1x01_P2.54mm_Vertical.step": height 8.54, standoff -3, extent -1.27,11.43 1.27,13.97
3D body "PinHeader_1x01_P2.54mm_Vertical.step": height 8.54, standoff -3, extent -1.27,16.51 1.27,19.05
3D body "PinHeader_1x01_P2.54mm_Vertical.step": height 8.54, standoff -3, extent -1.27,24.13 1.27,26.67

## PLS-1x14-2.54 [mm]
height 6
pads (14):
  rect 1.7x1.7 hole 1.1: 1(0,0)
  round 1.7 hole 1.1: 2(0,2.54) 3(0,5.08) 4(0,7.62) 5(0,10.16) 6(0,12.7) 7(0,15.24) 8(0,17.78) 9(0,20.32) 10(0,22.86) 11(0,25.4) 12(0,27.94) 13(0,30.48) 14(0,33.02)
Top Overlay:
  lines w0.3: -1.524,-1.524 -1.524,34.544 1.524,34.544 1.524,-1.524 -1.524,-1.524
Bottom Overlay:
  lines w0.3: -1.524,-1.524 -1.524,34.544 1.524,34.544 1.524,-1.524 -1.524,-1.524
Top Assembly:
  drawing of 280 lines, arcs and shapes, not listed
Top Component Outline:
  lines w0.3: -1.524,-1.524 -1.524,34.544 1.524,34.544 1.524,-1.524 -1.524,-1.524
Top Component Center:
  circle w0.1: c0,0 r1
  lines w0.1: -1.25,0 1.25,0 ; 0,-1.25 0,1.25
3D body "PinHeader_1x01_P2.54mm_Vertical.step": height 8.54, standoff -3, extent -1.27,31.75 1.27,34.29
3D body "PinHeader_1x01_P2.54mm_Vertical.step": height 8.54, standoff -3, extent -1.27,29.21 1.27,31.75
3D body "PinHeader_1x01_P2.54mm_Vertical.step": height 8.54, standoff -3, extent -1.27,26.67 1.27,29.21
3D body "PinHeader_1x01_P2.54mm_Vertical.step": height 8.54, standoff -3, extent -1.27,19.05 1.27,21.59
3D body "PinHeader_1x01_P2.54mm_Vertical.step": height 8.54, standoff -3, extent -1.27,21.59 1.27,24.13
3D body "PinHeader_1x01_P2.54mm_Vertical.step": height 8.54, standoff -3, extent -1.27,13.97 1.27,16.51
3D body "PinHeader_1x01_P2.54mm_Vertical.step": height 8.54, standoff -3, extent -1.27,8.89 1.27,11.43
3D body "PinHeader_1x01_P2.54mm_Vertical.step": height 8.54, standoff -3, extent -1.27,-1.27 1.27,1.27
3D body "PinHeader_1x01_P2.54mm_Vertical.step": height 8.54, standoff -3, extent -1.27,1.27 1.27,3.81
3D body "PinHeader_1x01_P2.54mm_Vertical.step": height 8.54, standoff -3, extent -1.27,3.81 1.27,6.35
3D body "PinHeader_1x01_P2.54mm_Vertical.step": height 8.54, standoff -3, extent -1.27,6.35 1.27,8.89
3D body "PinHeader_1x01_P2.54mm_Vertical.step": height 8.54, standoff -3, extent -1.27,11.43 1.27,13.97
3D body "PinHeader_1x01_P2.54mm_Vertical.step": height 8.54, standoff -3, extent -1.27,16.51 1.27,19.05
3D body "PinHeader_1x01_P2.54mm_Vertical.step": height 8.54, standoff -3, extent -1.27,24.13 1.27,26.67

## PLS-1x15-2.54 [mm]
height 6
pads (15):
  rect 1.7x1.7 hole 1.1: 1(0,0)
  round 1.7 hole 1.1: 2(0,2.54) 3(0,5.08) 4(0,7.62) 5(0,10.16) 6(0,12.7) 7(0,15.24) 8(0,17.78) 9(0,20.32) 10(0,22.86) 11(0,25.4) 12(0,27.94) 13(0,30.48) 14(0,33.02) 15(0,35.56)
Top Overlay:
  lines w0.3: -1.524,-1.524 1.524,-1.524 1.524,37.084 -1.524,37.084 -1.524,-1.524
Bottom Overlay:
  lines w0.3: -1.524,-1.524 1.524,-1.524 1.524,37.084 -1.524,37.084 -1.524,-1.524
Top Assembly:
  drawing of 300 lines, arcs and shapes, not listed
Top Component Outline:
  lines w0.3: -1.524,-1.524 1.524,-1.524 1.524,37.084 -1.524,37.084 -1.524,-1.524
Top Component Center:
  circle w0.1: c0,0 r1
  lines w0.1: -1.25,0 1.25,0 ; 0,-1.25 0,1.25
3D body "PinHeader_1x01_P2.54mm_Vertical.step": height 8.54, standoff -3, extent -1.27,31.75 1.27,34.29
3D body "PinHeader_1x01_P2.54mm_Vertical.step": height 8.54, standoff -3, extent -1.27,29.21 1.27,31.75
3D body "PinHeader_1x01_P2.54mm_Vertical.step": height 8.54, standoff -3, extent -1.27,26.67 1.27,29.21
3D body "PinHeader_1x01_P2.54mm_Vertical.step": height 8.54, standoff -3, extent -1.27,19.05 1.27,21.59
3D body "PinHeader_1x01_P2.54mm_Vertical.step": height 8.54, standoff -3, extent -1.27,21.59 1.27,24.13
3D body "PinHeader_1x01_P2.54mm_Vertical.step": height 8.54, standoff -3, extent -1.27,13.97 1.27,16.51
3D body "PinHeader_1x01_P2.54mm_Vertical.step": height 8.54, standoff -3, extent -1.27,8.89 1.27,11.43
3D body "PinHeader_1x01_P2.54mm_Vertical.step": height 8.54, standoff -3, extent -1.27,-1.27 1.27,1.27
3D body "PinHeader_1x01_P2.54mm_Vertical.step": height 8.54, standoff -3, extent -1.27,1.27 1.27,3.81
3D body "PinHeader_1x01_P2.54mm_Vertical.step": height 8.54, standoff -3, extent -1.27,3.81 1.27,6.35
3D body "PinHeader_1x01_P2.54mm_Vertical.step": height 8.54, standoff -3, extent -1.27,6.35 1.27,8.89
3D body "PinHeader_1x01_P2.54mm_Vertical.step": height 8.54, standoff -3, extent -1.27,11.43 1.27,13.97
3D body "PinHeader_1x01_P2.54mm_Vertical.step": height 8.54, standoff -3, extent -1.27,16.51 1.27,19.05
3D body "PinHeader_1x01_P2.54mm_Vertical.step": height 8.54, standoff -3, extent -1.27,24.13 1.27,26.67
3D body "PinHeader_1x01_P2.54mm_Vertical.step": height 8.54, standoff -3, extent -1.27,34.29 1.27,36.83

## PLS-1x16-2.54 [mm]
height 6
pads (16):
  rect 1.7x1.7 hole 1.1: 1(0,0)
  round 1.7 hole 1.1: 2(0,2.54) 3(0,5.08) 4(0,7.62) 5(0,10.16) 6(0,12.7) 7(0,15.24) 8(0,17.78) 9(0,20.32) 10(0,22.86) 11(0,25.4) 12(0,27.94) 13(0,30.48) 14(0,33.02) 15(0,35.56) 16(0,38.1)
Top Overlay:
  lines w0.3: -1.524,-1.524 1.524,-1.524 1.524,39.624 -1.524,39.624 -1.524,-1.524
Bottom Overlay:
  lines w0.3: -1.524,-1.524 1.524,-1.524 1.524,39.624 -1.524,39.624 -1.524,-1.524
Top Assembly:
  drawing of 320 lines, arcs and shapes, not listed
Top Component Outline:
  lines w0.3: -1.524,-1.524 1.524,-1.524 1.524,39.624 -1.524,39.624 -1.524,-1.524
Top Component Center:
  circle w0.1: c0,0 r1
  lines w0.1: -1.25,0 1.25,0 ; 0,-1.25 0,1.25
3D body "PinHeader_1x01_P2.54mm_Vertical.step": height 8.54, standoff -3, extent -1.27,34.29 1.27,36.83
3D body "PinHeader_1x01_P2.54mm_Vertical.step": height 8.54, standoff -3, extent -1.27,24.13 1.27,26.67
3D body "PinHeader_1x01_P2.54mm_Vertical.step": height 8.54, standoff -3, extent -1.27,16.51 1.27,19.05
3D body "PinHeader_1x01_P2.54mm_Vertical.step": height 8.54, standoff -3, extent -1.27,11.43 1.27,13.97
3D body "PinHeader_1x01_P2.54mm_Vertical.step": height 8.54, standoff -3, extent -1.27,6.35 1.27,8.89
3D body "PinHeader_1x01_P2.54mm_Vertical.step": height 8.54, standoff -3, extent -1.27,3.81 1.27,6.35
3D body "PinHeader_1x01_P2.54mm_Vertical.step": height 8.54, standoff -3, extent -1.27,1.27 1.27,3.81
3D body "PinHeader_1x01_P2.54mm_Vertical.step": height 8.54, standoff -3, extent -1.27,-1.27 1.27,1.27
3D body "PinHeader_1x01_P2.54mm_Vertical.step": height 8.54, standoff -3, extent -1.27,8.89 1.27,11.43
3D body "PinHeader_1x01_P2.54mm_Vertical.step": height 8.54, standoff -3, extent -1.27,13.97 1.27,16.51
3D body "PinHeader_1x01_P2.54mm_Vertical.step": height 8.54, standoff -3, extent -1.27,21.59 1.27,24.13
3D body "PinHeader_1x01_P2.54mm_Vertical.step": height 8.54, standoff -3, extent -1.27,19.05 1.27,21.59
3D body "PinHeader_1x01_P2.54mm_Vertical.step": height 8.54, standoff -3, extent -1.27,26.67 1.27,29.21
3D body "PinHeader_1x01_P2.54mm_Vertical.step": height 8.54, standoff -3, extent -1.27,29.21 1.27,31.75
3D body "PinHeader_1x01_P2.54mm_Vertical.step": height 8.54, standoff -3, extent -1.27,31.75 1.27,34.29
3D body "PinHeader_1x01_P2.54mm_Vertical.step": height 8.54, standoff -3, extent -1.27,36.83 1.27,39.37